# Altium footprint library SINA.PcbLib: 103 footprints (part 5 of 7)
Each footprint in its own frame and in the unit in brackets; x right, y up, seen from the top. Pads: shape width x height; smd on the part's side, far side on the other; paste and mask are expansions set on the pad; w line width, h text height; cw(c..) or ccw(c..) is an arc to the next point about the centre after c.
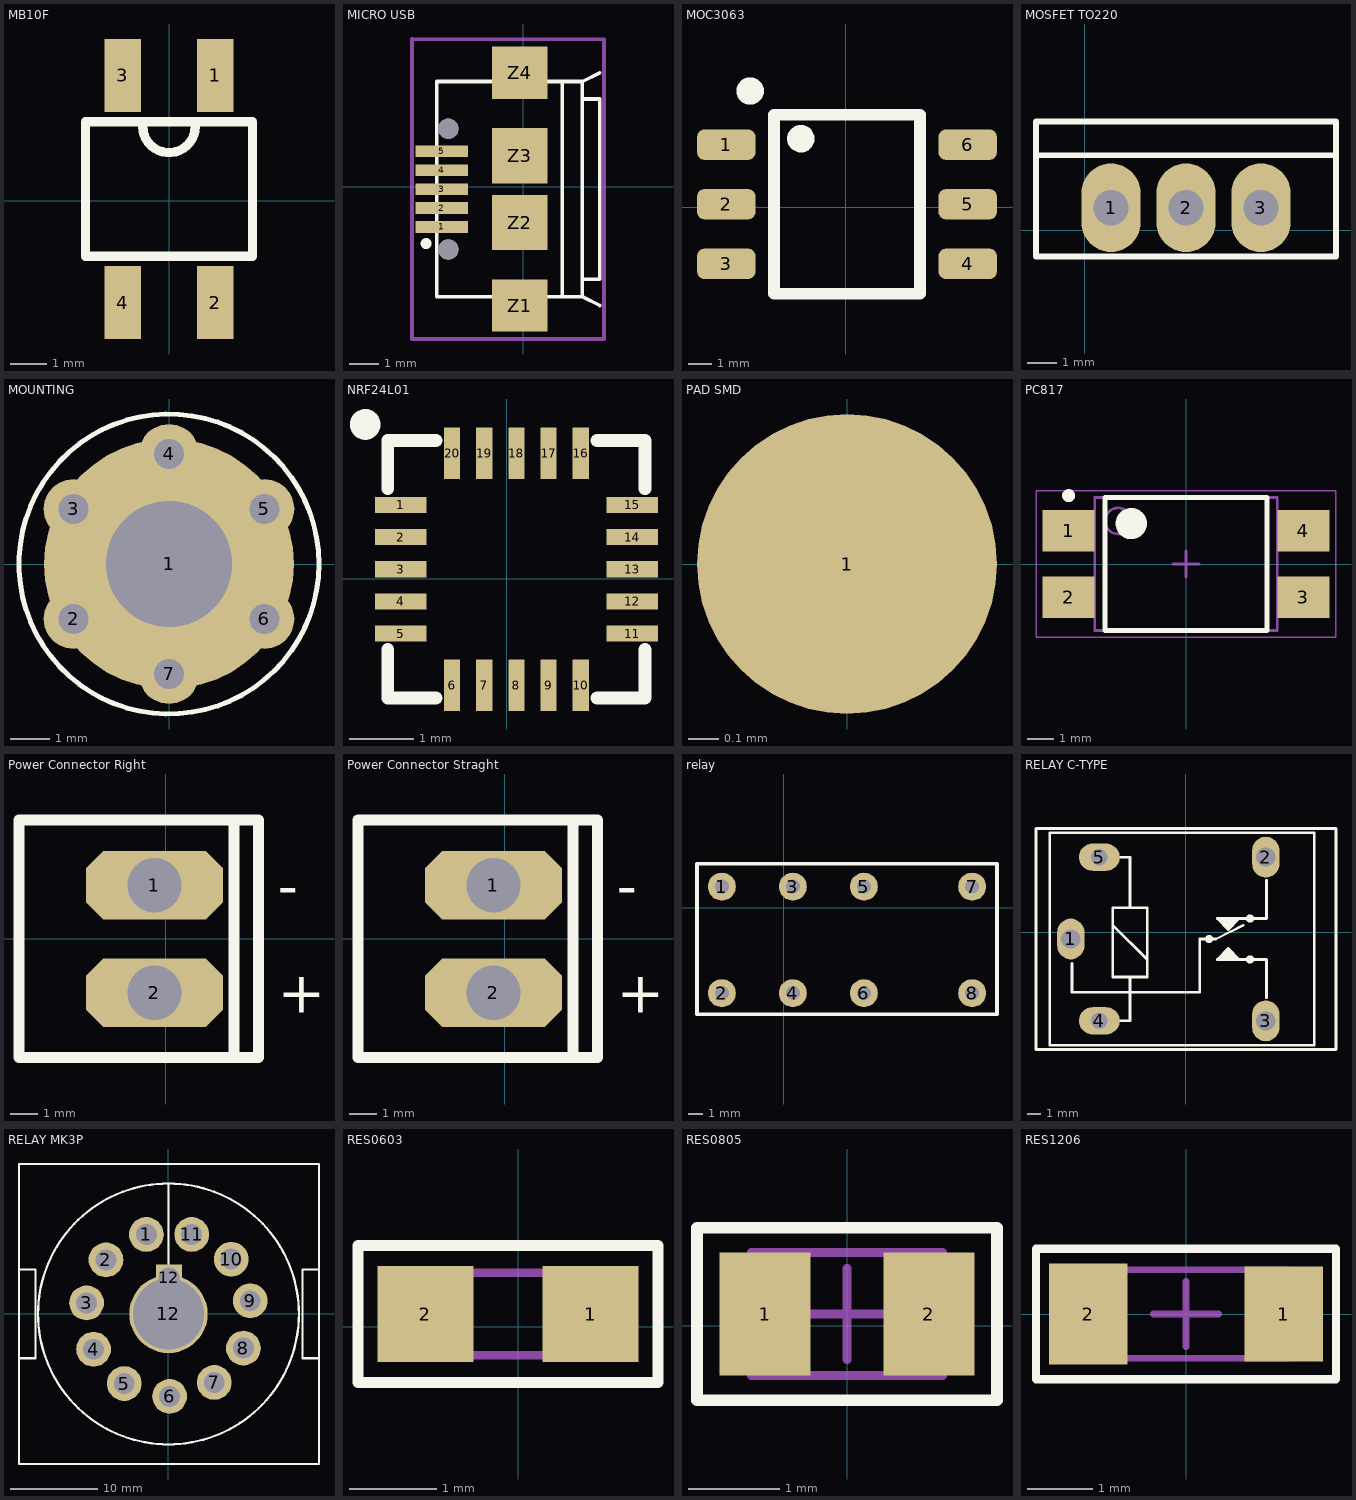
[diagram p4: the footprints below, top view; thin cyan lines are the x and y axes]

## MB10F [mm]
pads (4):
  rect 1x2 smd: 1(1.27,3.429) 2(1.27,-2.794) 3(-1.27,3.429) 4(-1.27,-2.794)
Top Overlay:
  lines w0.254: -0.718,2.032 ccw(c0,2.032) 0.718,2.032 ; -2.286,-1.524 -2.286,2.159 2.286,2.159 2.286,-1.524 -2.286,-1.524
3D body "User Library-MB10F TMBS-1.STEP": height 1.61, standoff 0, extent -2.45,-3.082 2.45,3.718

## MICRO USB [mm]
pads (11):
  rect 1.8x0.4 smd: 1(-2.802,-1.384) 2(-2.802,-0.734) 3(-2.802,-0.084) 4(-2.802,0.566) 5(-2.802,1.216)
  rect 1.9x1.8 smd: Z1(-0.127,-4.084) Z4(-0.127,3.916)
  rect 1.9x1.9 smd: Z2(-0.127,-1.234) Z3(-0.127,1.066)
  round 0.7 hole 0.7 unplated: ""(-2.577,-2.159) ""(-2.577,1.991)
Top Overlay:
  circle w0.254: c-3.342,-1.954 r0.06
  lines w0.127: 1.336,-3.784 1.336,3.616 ; 2.026,-3.184 2.623,-3.184 2.623,3.016 2.026,3.016 ; 2.626,-4.084 2.026,-3.784 ; 2.626,3.916 2.026,3.616 ; 2.026,-3.784 -2.974,-3.784 -2.974,3.616 2.026,3.616 ; 2.026,-3.784 2.026,3.616
Mechanical 15:
  lines w0.127: -3.827,5.066 -3.827,-5.234 2.769,-5.234 2.769,5.066 -3.827,5.076
3D body "629105136821.stp": height 2.69, standoff -0.61, extent -3.275,-4.084 2.629,3.916

## MOC3063 [mm]
pads (6):
  rrect50% 2.5x1.3 smd: 1(-5.08,2.667) 2(-5.08,0.127) 3(-5.08,-2.413) 4(5.207,-2.413) 5(5.207,0.127) 6(5.207,2.667)
Top Overlay:
  circle w0.6: c-4.064,4.953 r0.284
  circle w0.6: c-1.905,2.921 r0.284
  lines w0.5: -3.048,-3.683 3.175,-3.683 3.175,3.937 -3.048,3.937 -3.048,-3.683
3D body: height 3.7, standoff 0.2, extent -3.048,-3.683 3.175,3.937

## MOSFET TO220 [mm]
pads (3):
  oval 2x3 hole 1.2: 1(0.889,0.762) 2(3.429,0.762) 3(5.969,0.762)
Top Overlay:
  lines w0.2: -1.651,2.54 8.509,2.54 ; -1.651,-0.889 -1.651,3.683 8.509,3.683 8.509,-0.889 -1.651,-0.889
3D body "User Library-Transistor TO 220.STEP": height 18.8, standoff -7, extent -1.721,-0.817 8.579,3.683

## MOUNTING [mil]
pads (7):
  round 250 hole 125.98: 1(0,0)
  round 60 hole 30: 2(-95.26,-55) 3(-95.26,55) 4(0,110) 5(95.26,55) 6(95.26,-55) 7(0,-110)
Top Overlay:
  circle w5: c0,0 r150

## NRF24L01 [mm]
pads (20):
  rect 0.8x0.25 smd: 1(-1.65,1.15) 2(-1.65,0.65) 3(-1.65,0.15) 4(-1.65,-0.35) 5(-1.65,-0.85) 11(1.95,-0.85) 12(1.95,-0.35) 13(1.95,0.15) 14(1.95,0.65) 15(1.95,1.15)
  rect 0.25x0.8 smd: 6(-0.85,-1.65) 7(-0.35,-1.65) 8(0.15,-1.65) 9(0.65,-1.65) 10(1.15,-1.65) 16(1.15,1.95) 17(0.65,1.95) 18(0.15,1.95) 19(-0.35,1.95) 20(-0.85,1.95)
Top Overlay:
  circle w0.254: c-2.2,2.4 r0.112
  lines w0.2: -1.85,-1.1 -1.85,-1.85 -1.1,-1.85 ; -1.85,1.4 -1.85,2.15 -1.1,2.15 ; 1.4,-1.85 2.15,-1.85 2.15,-1.1 ; 1.4,2.15 2.15,2.15 2.15,1.4
3D body "User Library-QFN20 4x4.STEP": height 0.72, standoff -0.01, extent -1.875,-1.875 2.175,2.175

## PAD SMD [mm]
pads (1):
  round 1 smd: 1(0,0)

## PC817 [mm]
pads (4):
  rect 2x1.6 smd: 1(-4.5,1.27) 2(-4.5,-1.27) 3(4.5,-1.27) 4(4.5,1.27)
Top Overlay:
  circle w0.25: c-4.5,2.62 r0.125
  circle w0.6: c-2.1,1.55 r0.3
  lines w0.2: -3.1,-2.55 -3.1,2.55 3.1,2.55 3.1,-2.55 -3.1,-2.55
Mechanical 13:
  circle w0.1: c-2.6,1.65 r0.5
  lines w0.1: -3.5,-2.55 -3.5,2.55 3.5,2.55 3.5,-2.55 -3.5,-2.55
Mechanical 15:
  lines w0.05: -5.75,-2.8 -5.75,2.8 5.75,2.8 5.75,-2.8 -5.75,-2.8
  lines w0.1: -0.5,0 0.5,0 ; 0,-0.5 0,0.5
3D body "User Library-PC817_Gullwing.STEP": height -0.9, standoff -4.75, extent -5.15,-2.3 4.85,2.28

## Power Connector Right [mil]
pads (2):
  oct 198x99 hole 78.74: 1(-16.61,77.36) 2(-16.61,-78.64)
Top Overlay:
  lines w10: -17.01,171.36 -16.61,170.97
  lines w16: 133.29,-172.15 -212.6,-172.15 -212.6,171.36 133.39,171.36 ; 98.43,-172.15 98.43,171.36 133.86,171.36 133.86,-172.15 98.43,-172.15
  text "+" at 161.42,-107.48 h60
  text "-" at 161.42,46.46 h60
Mechanical 13:
  lines w3.94: -210.63,-175 132.64,-175 132.64,175 -210.63,175 -210.63,-175
3D body: height 295.28, standoff 259.84, extent -564.96,-106.3 -183.07,110.24
3D body: height 259.84, standoff 0, extent -301.18,-171.06 -183.07,178.94
3D body: height 184.82, standoff 129.92, extent -600.39,-106.3 -9.84,-51.29
3D body: height 184.82, standoff 129.92, extent -600.39,49.21 -9.84,104.22
3D body: height 177.17, standoff -98.43, extent -44.11,-106.2 10.9,-51.3
3D body: height 177.17, standoff -98.43, extent -44.11,49.8 10.9,104.7

## Power Connector Straght [mil]
pads (2):
  oct 198x99 hole 78.74: 1(-16.61,77.36) 2(-16.61,-78.64)
Top Overlay:
  lines w10: -17.01,171.36 -16.61,170.97
  lines w16: 133.29,-172.15 -212.6,-172.15 -212.6,171.36 133.39,171.36 ; 98.43,-172.15 133.86,-172.15 133.86,171.36 98.43,171.36 98.43,-172.15
  text "-" at 161.42,46.46 h60
  text "+" at 161.42,-107.48 h60
Mechanical 13:
  lines w3.94: -210.63,-175 -210.63,175 132.64,175 132.64,-175 -210.63,-175
3D body: height 295.28, standoff -98.43, extent -44.16,-106.19 10.95,-51.08
3D body: height 295.28, standoff -98.43, extent -44.16,49.81 10.95,104.92
3D body: height 118.11, standoff 0, extent -212.6,-175 96.46,175
3D body: height 393.7, standoff 0, extent 96.22,-180.9 128.19,169.1

## relay [mm]
pads (8):
  round 2 hole 1: 1(-4.445,1.524) 2(-4.445,-6.096) 3(0.635,1.524) 4(0.635,-6.096) 5(5.715,1.524) 6(5.715,-6.096) 7(13.462,1.524) 8(13.462,-6.096)
Top Overlay:
  lines w0.254: -6.223,-7.62 -6.223,-6.731 -6.223,3.175 15.24,3.175 15.24,-7.62 -6.223,-7.62
3D body: height 10, standoff 0, extent -6.223,-7.62 15.24,3.175

## RELAY C-TYPE [mm]
pads (5):
  oval 2x3 hole 1.4: 1(-8.42,-0.508) 2(5.88,5.492) 3(5.88,-6.508)
  oval 3x2 hole 1.2: 4(-6.32,-6.508) 5(-6.32,5.492)
Top Overlay:
  circle w0.2: c4.73,-2.008 r0.2
  circle w0.2: c4.73,0.992 r0.2
  circle w0.2: c1.73,-0.508 r0.2
  region: 2.33,-2.008 3.93,-2.008 3.13,-1.208
  region: 2.33,0.992 3.93,0.992 3.13,0.192
  lines w0.2: -8.332,-2.308 -8.332,-4.408 1.03,-4.408 1.03,-0.508 2.23,-0.508 4.23,0.492 ; -5.348,0.508 -2.808,-2.032 ; -5.02,-6.508 -4.078,-6.508 -4.078,-3.302 ; -5.02,5.492 -4.078,5.492 -4.078,1.778 ; 3.93,-2.008 3.13,-1.208 2.33,-2.008 5.93,-2.008 5.93,-4.808 ; 3.93,0.992 3.13,0.192 2.33,0.992 5.93,0.992 5.93,3.792 ; -4.078,1.778 -5.348,1.778 -5.348,-3.302 -2.808,-3.302 -2.808,1.778 -4.078,1.778 ; -10.97,-8.608 11.03,-8.608 11.03,7.592 -10.97,7.592 -10.97,-8.608 ; -9.97,-8.308 9.43,-8.308 9.43,7.292 -9.97,7.292 -9.97,-8.308
3D body "User Library-RELE.step": height 15.5, standoff -2.5, extent -10.07,-8.458 9.43,7.442

## RELAY MK3P [mm]
pads (13):
  round 4 hole 2.4: 1(-2.54,9.144) 2(-7.19,6.22) 3(-9.42,1.27) 4(-8.62,-4.06) 5(-5.08,-8.001) 6(0.13,-9.48) 7(5.27,-7.88) 8(8.62,-3.93) 9(9.398,1.524) 10(7.21,6.3) 11(2.667,9.144)
  round 9 hole 8.2: 12(0,0)
  rect 3x3 hole 2.4 square: 12(0.05,4.16)
Top Overlay:
  circle w0.254: c0,0 r15
  lines w0.2: -17.19,-17.25 -17.19,17.24 -1.33,17.24 17.31,17.24 17.31,-17.24 17.3,-17.25 -17.19,-17.25
  lines w0.25: -17.1,-5.1 -15.3,-5.1 -15.3,5.1 -17.1,5.1 ; 0,5.6 0,14.9 ; 17.2,-5.1 15.4,-5.1 15.4,5.1 17.2,5.1
3D body "MKS3P.step": height 53.3, standoff -14, extent -17.186,-17.25 17.314,17.25

## RES0603 [mm]
pads (2):
  rect 1.1x1.1 smd: 1(0.833,0.145) 2(-1.067,0.145)
Top Overlay:
  lines w0.127: -1.844,-0.642 1.61,-0.642 1.61,0.932 -1.844,0.932 -1.844,-0.642
Mechanical 13:
  lines w0.1: -0.967,-0.33 -0.967,0.62 0.733,0.62 0.733,-0.33 -0.967,-0.33
3D body: height 0.6, standoff 0, extent -0.967,-0.33 0.733,0.62

## RES0805 [mm]
pads (2):
  rect 1x1.35 smd: 1(-0.9,0.127) 2(0.9,0.127)
Top Overlay:
  lines w0.127: -1.65,-0.823 1.65,-0.823 1.65,1.077 -1.65,1.077 -1.65,-0.823
Mechanical 13:
  lines w0.1: -1.05,-0.548 1.05,-0.548 1.05,0.802 -1.05,0.802 -1.05,-0.548
Mechanical 15:
  lines w0.1: -0.5,0.127 0.5,0.127 ; 0,-0.373 0,0.627
3D body: height 0.6, standoff 0, extent 0.7,-0.548 1.05,0.802
3D body: height 0.6, standoff 0, extent -1.05,-0.548 -0.7,0.802
3D body: height 0.6, standoff 0, extent -0.7,-0.548 0.7,0.802

## RES1206 [mm]
pads (2):
  rect 1.2x1.45 smd: 1(1.5,0)
  rect 1.2x1.55 smd: 2(-1.5,0)
Top Overlay:
  lines w0.127: -2.3,-1 -2.3,1 2.3,1 2.3,-1 -2.3,-1
Mechanical 13:
  lines w0.1: -1.59,-0.675 -1.59,0.675 1.56,0.675 1.56,-0.675 -1.59,-0.675
Mechanical 15:
  lines w0.1: -0.5,0 0.5,0 ; 0,-0.5 0,0.5
3D body: height 0.6, standoff 0, extent -0.89,-0.675 0.89,0.675
3D body: height 0.6, standoff 0, extent -1.57,-0.675 -0.89,0.675
3D body: height 0.6, standoff 0, extent 0.89,-0.675 1.57,0.675